# Altium footprint library TarabusLibrary.PcbLib: 591 footprints (part 17 of 37)
Each footprint in its own frame and in the unit in brackets; x right, y up, seen from the top. Pads: shape width x height; smd on the part's side, far side on the other; paste and mask are expansions set on the pad; w line width, h text height; cw(c..) or ccw(c..) is an arc to the next point about the centre after c.
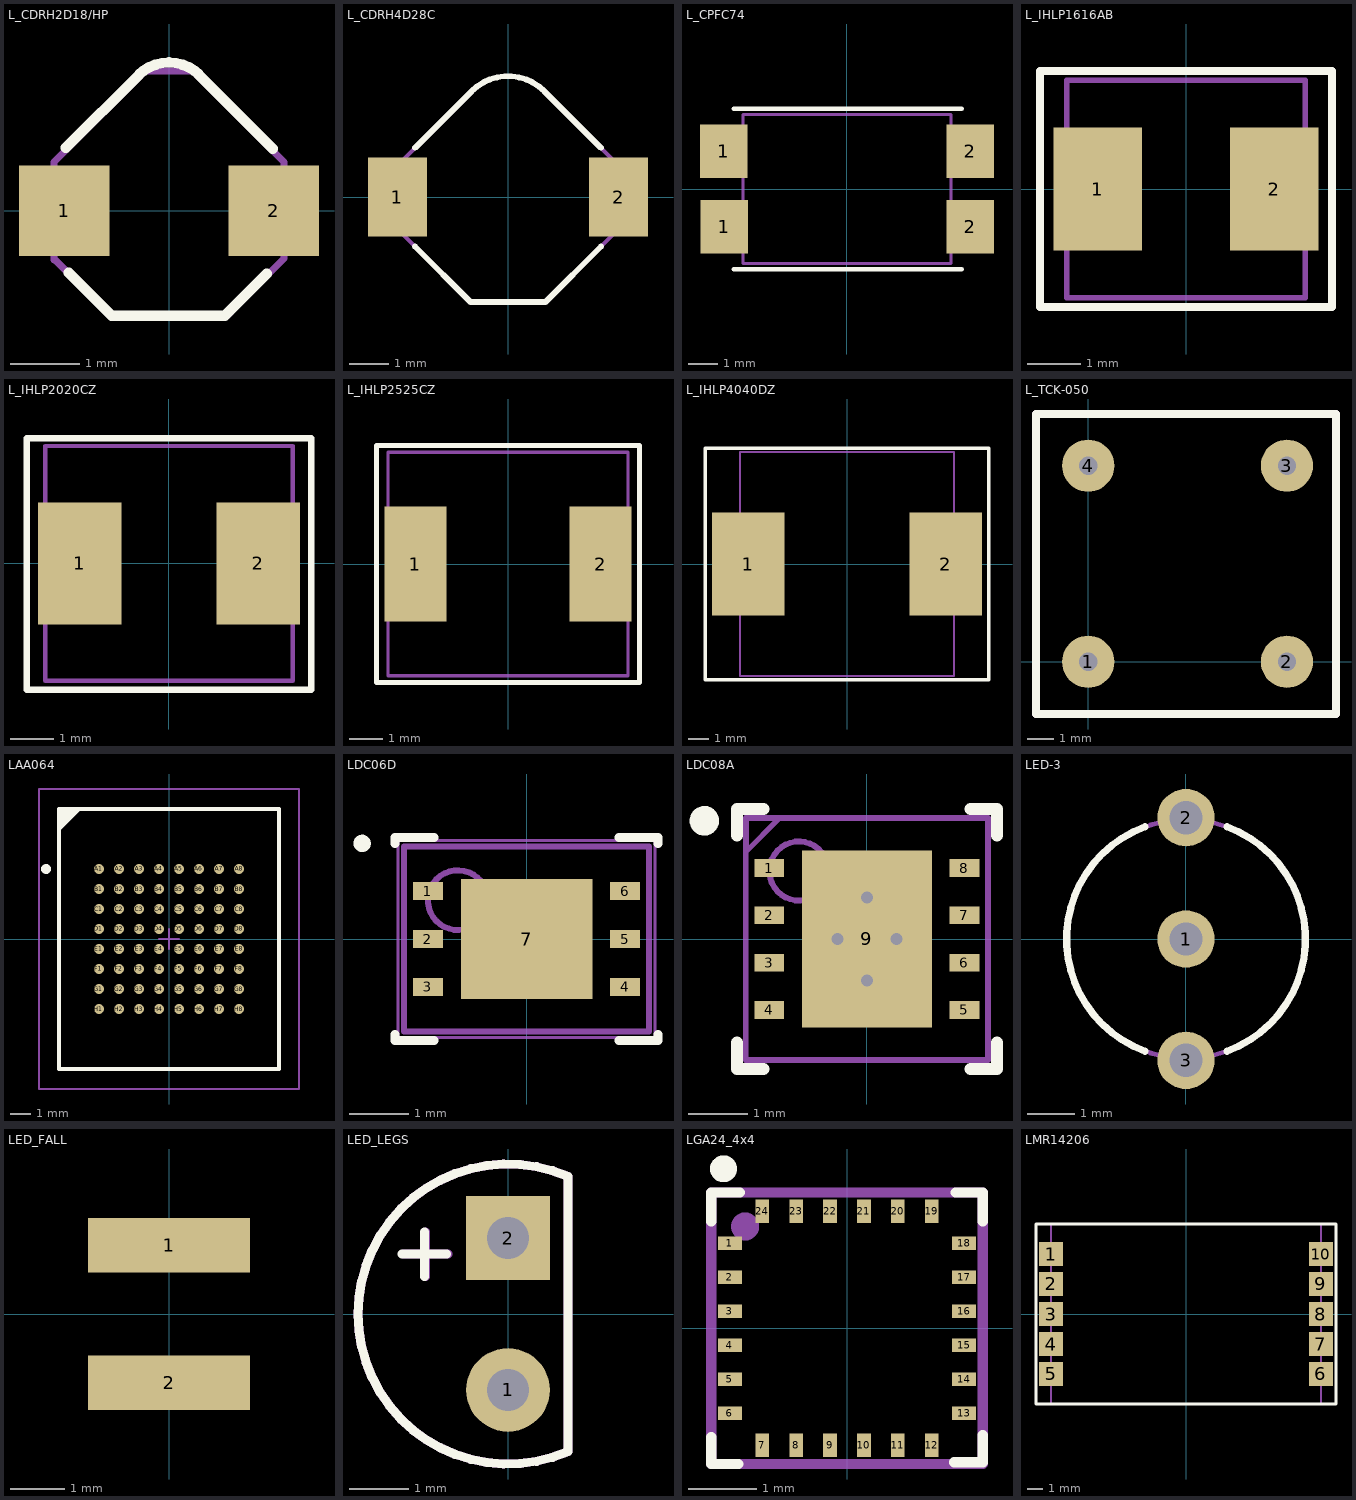
[diagram p16: the footprints below, top view; thin cyan lines are the x and y axes]

## L_CDRH2D18/HP [mm]
height 2
pads (2):
  rect 1.3x1.3 smd: 1(-1.5,0) 2(1.5,0)
Top Overlay:
  lines w0.15: -1.478,0.903 -0.436,1.945 cw(c0,1.508) 0.436,1.945 ; -1.438,-0.888 -0.823,-1.502 0.798,-1.502 1.4,-0.9 ; 0.425,1.95 1.488,0.888
Mechanical 7:
  lines w0.1: -1.65,-0.707 -1.65,0.7 -0.35,2 0.35,2 1.65,0.7 1.65,-0.685 0.955,-1.381 0.835,-1.5 -0.7,-1.5 -0.835,-1.5 -1.638,-0.697
Mechanical 10:
  text ".Comment" at -1.225,-3.6 h0.6
  text ".Designator" at -1.9,3.425 h0.8
3D body: height 2, standoff 0.05, extent -1.65,-1.5 1.65,2

## L_CDRH4D28C [mm]
height 3
pads (2):
  rect 1.5x2 smd: 1(-2.8,0) 2(2.8,0)
Top Overlay:
  lines w0.15: -2.356,-1.25 -0.955,-2.652 0.955,-2.652 2.356,-1.25 ; -2.353,1.253 -0.919,2.687 cw(c0,1.768) 0.919,2.687 2.353,1.253
Mechanical 7:
  lines w0.1: -2.899,-0.707 -0.955,-2.652 0.955,-2.652 2.899,-0.707 2.899,0.707 0.919,2.687 ccw(c0,1.768) -0.919,2.687 -2.899,0.707 -2.899,-0.707
Mechanical 10:
  text ".Comment" at -1.225,-3.6 h0.6
  text ".Designator" at -1.9,3.425 h0.8
3D body: height 3, standoff 0, extent -1.29,0.47 1.3,3.065
3D body: height 3, standoff 0, extent -2.899,-2.652 2.899,2.687

## L_CPFC74 [mm]
height 5
pads (4):
  rect 1.6x1.8 smd: 1(-4.14,1.27) 1(-4.13,-1.27) 2(4.14,-1.27) 2(4.14,1.27)
Top Overlay:
  lines w0.15: -3.8,-2.7 3.85,-2.7 ; -3.8,2.7 3.85,2.7
Mechanical 7:
  lines w0.1: -3.5,-2.5 -3.5,2.5 3.5,2.5 3.5,-2.5 -3.5,-2.5
Mechanical 10:
  text ".Designator" at -3.35,3.16 h0.8
  text ".Comment" at -3.38,-0.96 h0.6
3D body: height 5, standoff 0, extent -3.5,-2.5 3.5,2.5

## L_IHLP1616AB [mm]
height 1
pads (2):
  rect 1.65x2.3 smd: 1(-1.65,0) 2(1.65,0)
Top Overlay:
  lines w0.15: -2.725,-2.2 -2.725,2.2 2.725,2.2 2.725,-2.2 -2.725,-2.2
Mechanical 7:
  lines w0.1: -2.225,-2.03 2.225,-2.03 2.225,2.03 -2.225,2.03 -2.225,-2.03
Mechanical 10:
  text ".Designator" at -1.425,1.55 h0.8
  text ".Comment" at -1.425,-1.875 h0.6
3D body: height 1.2, standoff 0.05, extent -2.225,-2.025 2.225,2.025

## L_IHLP2020CZ [mm]
height 3
pads (2):
  rect 1.925x2.8 smd: 1(-2.05,0) 2(2.05,0)
Top Overlay:
  lines w0.15: -3.275,-2.9 -3.275,2.875 3.275,2.875 3.275,-2.9 -3.275,-2.9
Mechanical 7:
  lines w0.1: 2.85,-2.7 2.85,2.7 -2.85,2.7 -2.85,-2.7 2.85,-2.7 ; 2.85,-2.7 2.85,-2.7
Mechanical 10:
  text ".Designator" at -1.475,3.125 h0.8
  text ".Comment" at -1.125,-3.525 h0.6
3D body: height 3, standoff 0.05, extent -2.85,-2.7 2.85,2.7

## L_IHLP2525CZ [mm]
height 3
pads (2):
  rect 1.85x3.45 smd: 1(-2.775,0) 2(2.775,0)
Top Overlay:
  lines w0.15: -3.95,-3.55 3.95,-3.55 3.95,3.55 -3.95,3.55 -3.95,-3.55
Mechanical 7:
  lines w0.1: -3.6,-3.35 3.6,-3.35 3.6,3.35 -3.6,3.35 -3.6,-3.35
Mechanical 10:
  text ".Comment" at -1.05,-4.15 h0.6
  text ".Designator" at -1.5,4 h0.8
3D body: height 3, standoff 0.05, extent -3.6,-3.35 3.6,3.35

## L_IHLP4040DZ [mm]
height 4
pads (2):
  rect 3.5x4.95 smd: 1(-4.75,0) 2(4.75,0)
Top Overlay:
  lines w0.15: -6.825,-5.575 6.825,-5.575 6.825,5.575 -6.825,5.575 -6.825,-5.575
Mechanical 7:
  lines w0.1: -5.15,-5.4 5.15,-5.4 5.15,5.4 -5.15,5.4 -5.15,-5.4
Mechanical 10:
  text ".Comment" at -0.975,-6.275 h0.6
  text ".Designator" at -1.9,5.9 h0.8
3D body: height 4, standoff 0.05, extent -5.175,-5.375 5.125,5.4

## L_TCK-050 [mm]
pads (4):
  round 2 hole 0.7: 1(0,0) 2(7.62,0) 3(7.62,7.52) 4(0,7.52)
Top Overlay:
  lines w0.3: -2,-2 9.5,-2 9.5,9.5 -2,9.5 -2,-2
Mechanical 7:
  lines w0.3: -2,-2 9.5,-2 9.5,9.5 -2,9.5 -2,-2
Mechanical 10:
  text ".Designator" at 6.5,11 h0.8
  text ".Comment" at 6.5,10 h0.6
3D body: height 8.8, standoff 0, extent -2,-2 9.5,9.5

## LAA064 [mm] "64-Ball Fortified Ball Grid Array Rectangular 1 mm Pitch"
height 1.4
pads (64):
  round 0.5 smd: A1(-3.5,3.5) A2(-2.5,3.5) A3(-1.5,3.5) A4(-0.5,3.5) A5(0.5,3.5) A6(1.5,3.5) A7(2.5,3.5) A8(3.5,3.5) B1(-3.5,2.5) B2(-2.5,2.5) B3(-1.5,2.5) B4(-0.5,2.5) B5(0.5,2.5) B6(1.5,2.5) B7(2.5,2.5) B8(3.5,2.5) C1(-3.5,1.5) C2(-2.5,1.5) C3(-1.5,1.5) C4(-0.5,1.5) C5(0.5,1.5) C6(1.5,1.5) C7(2.5,1.5) C8(3.5,1.5) D1(-3.5,0.5) D2(-2.5,0.5) D3(-1.5,0.5) D4(-0.5,0.5) D5(0.5,0.5) D6(1.5,0.5) D7(2.5,0.5) D8(3.5,0.5) E1(-3.5,-0.5) E2(-2.5,-0.5) E3(-1.5,-0.5) E4(-0.5,-0.5) E5(0.5,-0.5) E6(1.5,-0.5) E7(2.5,-0.5) E8(3.5,-0.5) F1(-3.5,-1.5) F2(-2.5,-1.5) F3(-1.5,-1.5) F4(-0.5,-1.5) F5(0.5,-1.5) F6(1.5,-1.5) F7(2.5,-1.5) F8(3.5,-1.5) G1(-3.5,-2.5) G2(-2.5,-2.5) G3(-1.5,-2.5) G4(-0.5,-2.5) G5(0.5,-2.5) G6(1.5,-2.5) G7(2.5,-2.5) G8(3.5,-2.5) H1(-3.5,-3.5) H2(-2.5,-3.5) H3(-1.5,-3.5) H4(-0.5,-3.5) H5(0.5,-3.5) H6(1.5,-3.5) H7(2.5,-3.5) H8(3.5,-3.5)
Top Overlay:
  circle w0.25: c-6.15,3.5 r0.125
  region: -4.5,6.5 -5.5,5.5 -5.5,6.5
  lines w0.2: -5.5,5.5 -4.5,6.5 ; -5.5,-6.5 -5.5,6.5 5.5,6.5 5.5,-6.5 -5.5,-6.5
Mechanical 13:
  lines w0.1: -5.5,-6.5 -5.5,6.5 5.5,6.5 5.5,-6.5 -5.5,-6.5
Mechanical 15:
  lines w0.1: -0.5,0 0.5,0 ; 0,-0.5 0,0.5 ; -6.5,-7.5 -6.5,7.5 6.5,7.5 6.5,-7.5 -6.5,-7.5
3D body: height 1.4, standoff 0, extent -5.5,-6.5 5.5,6.5

## LDC06D [mm] "PSON, 6-Leads, Body 3x4 mm, Pitch 0.8mm, NSC Recommended"
height 0.8
pads (7):
  rect 0.5x0.3 smd paste-0.15 mask+0.051: 1(-1.65,0.8) 2(-1.65,0) 3(-1.65,-0.8) 4(1.65,-0.8) 5(1.65,0) 6(1.65,0.8)
  rect 2.2x2 smd paste-1 mask+0.051: 7(0,0)
Top Overlay:
  circle w0.15: c-2.75,1.6 r0.069
  lines w0.15: -2.2,-1.7 -2.2,-1.6 ; -2.2,1.6 -2.2,1.7 ; -2.195,-1.7 -1.55,-1.7 ; -2.195,1.7 -1.55,1.7 ; 1.55,-1.7 2.195,-1.7 ; 1.55,1.7 2.195,1.7 ; 2.2,-1.7 2.2,-1.6 ; 2.2,1.6 2.2,1.7
Top Paste:
  region: 2,0.15 1.5,0.15 1.5,-0.15 2,-0.15
  rectangle: -2,-0.15 -1.5,0.15
  rectangle: -2,-0.95 -1.5,-0.65
  region: 2,-0.65 1.5,-0.65 1.5,-0.95 2,-0.95
  region: 2,0.95 1.5,0.95 1.5,0.65 2,0.65
  rectangle: -2,0.65 -1.5,0.95
  region: -0.15,0.9 -1,0.9 -1,0.15 -0.15,0.15
  rectangle: 0.15,-0.9 1,-0.15
  region: -0.15,-0.15 -1,-0.15 -1,-0.9 -0.15,-0.9
  rectangle: 0.15,0.15 1,0.9
Mechanical 7:
  lines w0.05: -2.15,-1.65 -2.15,1.65 2.15,1.65 2.15,-1.65 -2.15,-1.65
  lines w0.1: -0.5,0 0.5,0 ; 0,-0.5 0,0.5
Mechanical 9:
  circle w0.1: c-1.15,0.65 r0.5
  lines w0.1: -2.05,-1.55 2.05,-1.55 2.05,1.55 -2.05,1.55 -2.05,-1.55
3D body: height 0.8, standoff 0, extent -2.049,-1.549 2.049,1.549

## LDC08A [mm] "PSON, 8-Leads, Body 4x4mm, Pitch 0.8mm, NSC Recommended"
height 0.8
pads (9):
  rect 0.5x0.3 smd mask+0.051: 1(-1.65,1.2) 2(-1.65,0.4) 3(-1.65,-0.4) 4(-1.65,-1.2) 5(1.65,-1.2) 6(1.65,-0.4) 7(1.65,0.4) 8(1.65,1.2)
  rect 2.2x3 smd paste-1.5 mask+0.051: 9(0,0)
via -0.5,0 diameter 0.5 hole 0.2
via 0.5,0 diameter 0.5 hole 0.2
via 0,0.7 diameter 0.5 hole 0.2
via 0,-0.7 diameter 0.5 hole 0.2
Top Overlay:
  circle w0.25: c-2.75,2 r0.125
  lines w0.2: -2.2,-1.75 -2.2,-2.2 -1.75,-2.2 ; -2.2,1.75 -2.2,2.2 -1.75,2.2 ; 1.75,-2.2 2.2,-2.2 2.2,-1.75 ; 1.75,2.2 2.2,2.2 2.2,1.75
Top Paste:
  region: 1,1.4 0.15,1.4 0.15,0.15 1,0.15
  rectangle: -1,0.15 -0.15,1.4
  rectangle: -1,-1.4 -0.15,-0.15
  region: 1,-0.15 0.15,-0.15 0.15,-1.4 1,-1.4
Mechanical 7:
  lines w0.05: -2.05,1.45 -1.45,2.05 ; -2.05,2.029 -1.494,2.029 ; -2.037,1.513 -1.525,2.025 ; -2.021,1.494 -2.021,2.05 ; -2.05,-2.05 2.05,-2.05 2.05,2.057 -2.05,2.057 -2.05,-2.05
  lines w0.1: -0.5,0 0.5,0 ; 0,-0.5 0,0.5
Mechanical 9:
  circle w0.1: c-1.15,1.15 r0.5
  lines w0.1: -2.05,-2.05 2.05,-2.05 2.05,2.05 -2.05,2.05 -2.05,-2.05
Mechanical 10:
  text ".Comment" at -0.9,2.5 h0.6
  text ".Designator" at -0.9,-2.8 h0.6
3D body: height 0.8, standoff 0, extent -2.05,-2.05 2.05,2.05

## LED-3 [mm]
pads (3):
  round 1.2 hole 0.7: 1(0,0) 2(0,2.54) 3(0,-2.54)
Top Overlay:
  lines w0.15: -0.855,-2.349 cw(c0,0) -0.855,2.349 ; 0.855,-2.349 ccw(c0,0) 0.855,2.349
Mechanical 7:
  circle w0.1: c0,0 r2.5
Mechanical 10:
  text ".Designator" at -0.625,3.575 h0.8
  text ".Comment" at -0.5,-3.875 h0.6

## LED_FALL [mm]
pads (2):
  rect 3x1 smd: 1(0,1.27) 2(0,-1.27)

## LED_LEGS [mm]
height 7.6
pads (2):
  round 1.4 hole 0.7: 1(0,-1.27)
  rect 1.4x1.4 hole 0.7: 2(0,1.27)
Top Overlay:
  lines w0.15: -1.775,1 -1.025,1 ; -1.4,0.625 -1.4,1.375 ; 1,-2.3 cw(c0,0) 1,2.3 1,-2.3
Mechanical 7:
  lines w0.15: -1.75,1 -1,1 ; -1.375,0.625 -1.375,1.375 ; 1,-2.3 cw(c0,0) 1,2.3 1,-2.3
Mechanical 10:
  text ".Comment" at 0.25,-3.5 h0.6
  text ".Designator" at 1,2.5 h0.8
3D body "ИК светодиод L-34SF4C.STEP": height 2.15, standoff -1.65, extent -0.099,-1.9 7.699,1.9

## LGA24_4x4 [mm]
pads (24):
  rect 0.35x0.2 smd: 1(-1.725,1.25) 2(-1.725,0.75) 3(-1.725,0.25) 4(-1.725,-0.25) 5(-1.725,-0.75) 6(-1.725,-1.25) 13(1.725,-1.25) 14(1.725,-0.75) 15(1.725,-0.25) 16(1.725,0.25) 17(1.725,0.75) 18(1.725,1.25)
  rect 0.2x0.35 smd: 7(-1.25,-1.725) 8(-0.75,-1.725) 9(-0.25,-1.725) 10(0.25,-1.725) 11(0.75,-1.725) 12(1.25,-1.725) 19(1.25,1.725) 20(0.75,1.725) 21(0.25,1.725) 22(-0.25,1.725) 23(-0.75,1.725) 24(-1.25,1.725)
Top Overlay:
  circle w0.254: c-1.821,2.35 r0.071
  lines w0.15: -2,-1.6 -2,-2 -1.6,-2 ; -2,1.575 -2,2 -1.575,2 ; 1.575,-1.975 2,-1.975 2,-1.575 ; 1.6,2 2,2 2,1.575
Mechanical 7:
  circle w0.254: c-1.5,1.5 r0.079
  lines w0.15: -2,-2 -2,2 2,2 2,-2 -2,-2
Mechanical 10:
  text ".Comment" at -0.6,2.65 h0.6
  text ".Designator" at -0.625,3.225 h0.8
3D body "LGA_4x4x1.STEP": height 1, standoff 0, extent -2,-2 2,2

## LMR14206 [mm]
height 5
pads (10):
  rect 1.6x1.6 smd: 1(-9,4) 2(-9,2) 3(-9,0) 4(-9,-2) 5(-9,-4) 6(9,-4) 7(9,-2) 8(9,0) 9(9,2) 10(9,4)
Top Overlay:
  lines w0.2: -10,-6 -10,6 10,6 10,-6 -10,-6
Mechanical 7:
  lines w0.15: -9,-6 9,-6 9,6 -9,6 -9,-6
3D body "KPTV.E11.013.98.00.step": height 3.5, standoff 0.09, extent -9,-6 9,6